# Altium footprint library 我的器件.PCBLIB: 450 footprints (part 22 of 29)
Each footprint in its own frame and in the unit in brackets; x right, y up, seen from the top. Pads: shape width x height; smd on the part's side, far side on the other; paste and mask are expansions set on the pad; w line width, h text height; cw(c..) or ccw(c..) is an arc to the next point about the centre after c.
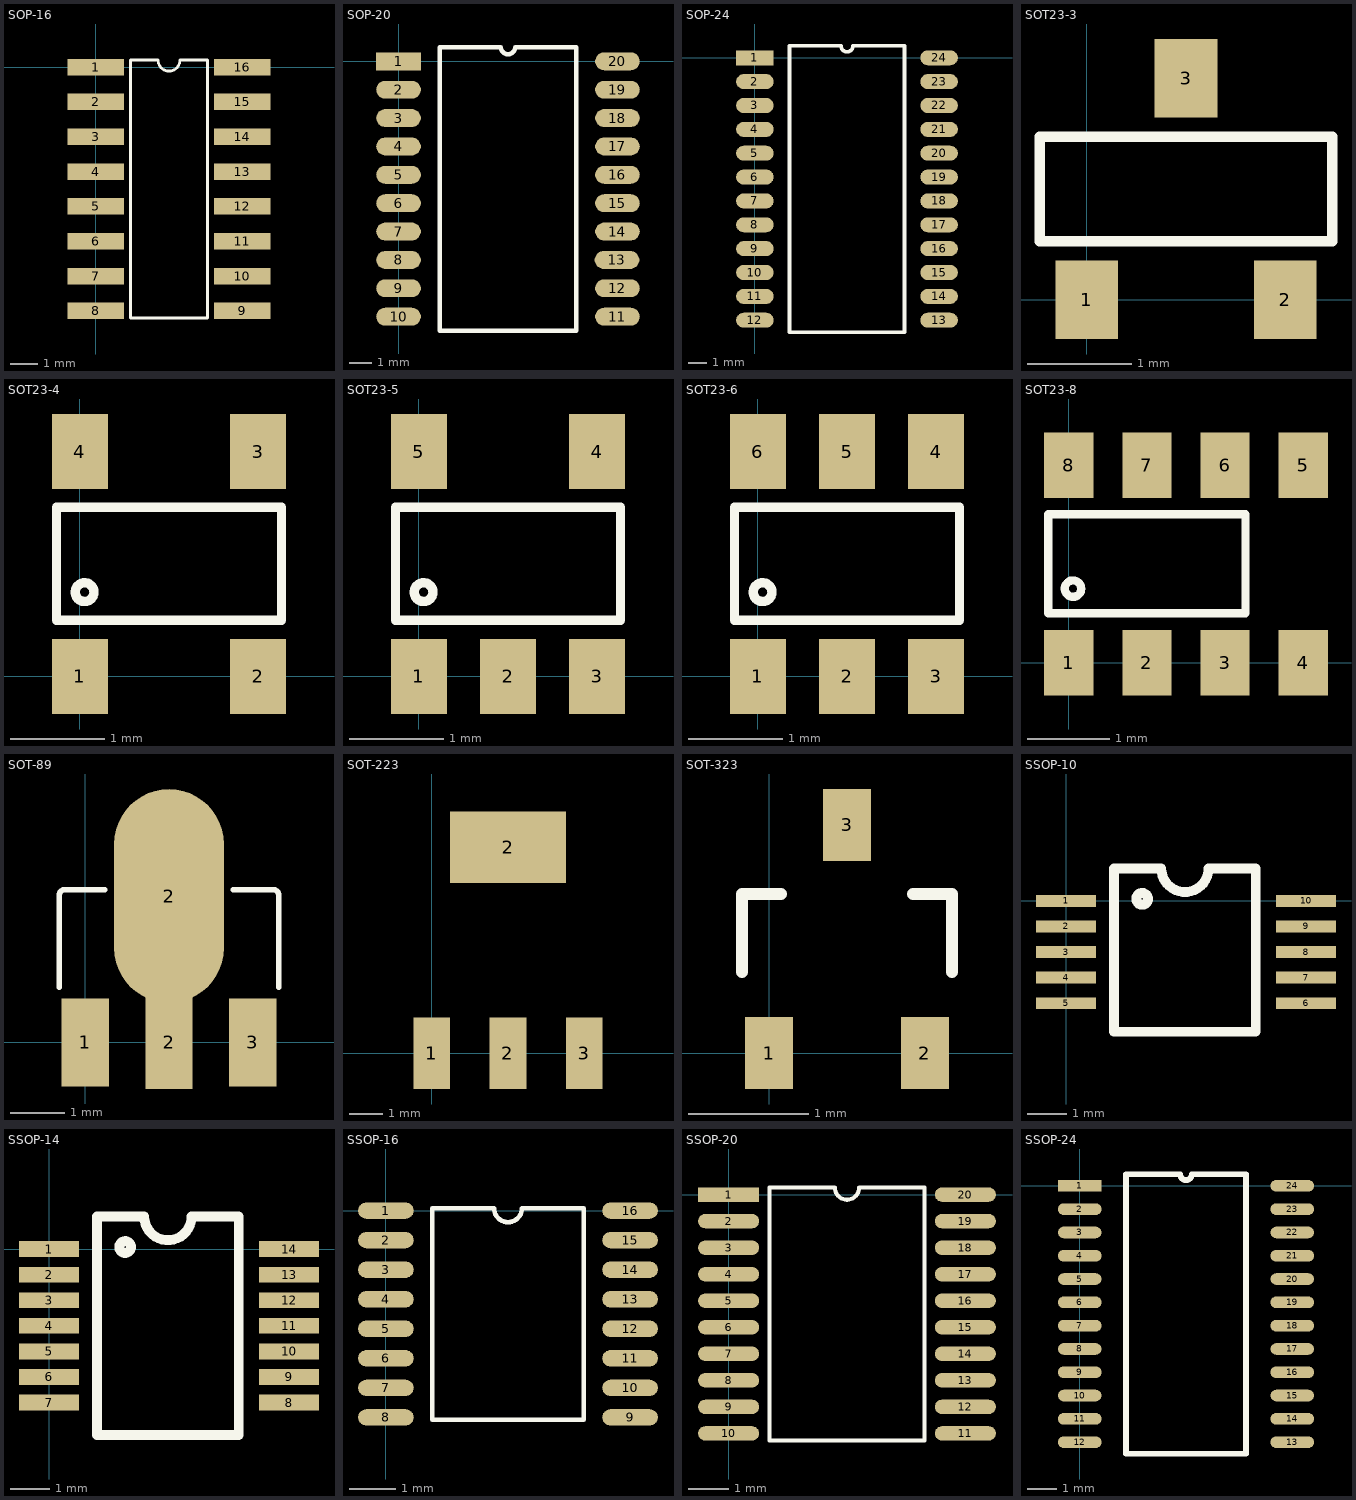
[diagram p21: the footprints below, top view; thin cyan lines are the x and y axes]

## SOP-16 [mm]
height 2
pads (16):
  rect 2.05x0.6 smd: 1(0,0) 2(0,-1.27) 3(0,-2.54) 4(0,-3.81) 5(0,-5.08) 6(0,-6.35) 7(0,-7.62) 8(0,-8.89) 9(5.35,-8.89) 10(5.35,-7.62) 11(5.35,-6.35) 12(5.35,-5.08) 13(5.35,-3.81) 14(5.35,-2.54) 15(5.35,-1.27) 16(5.35,0)
Top Overlay:
  lines w0.1: 4.075,0.255 ccw(c4.075,0.255) 4.075,0.255 ; 4.075,0.255 4.075,-9.145 1.275,-9.145 1.275,0.255 2.275,0.255 ccw(c2.675,0.255) 2.675,-0.145 ccw(c2.675,0.255) 3.075,0.255 4.075,0.255 ; 3.175,0.255 ccw(c3.175,0.255) 3.175,0.255
3D body: height 1.5, standoff 0.2, extent 0.675,-9.445 4.675,0.555
3D body: height 0.2, standoff 0, extent -0.457,-0.254 0.243,0.254
3D body: height 0.9, standoff 0, extent 0.243,-0.254 0.446,0.254
3D body: height 0.9, standoff 0.7, extent 0.446,-0.254 0.7,0.254
3D body: height 1.61, standoff 0.1, extent 1.178,-0.726 2.174,0.272
3D body: height 0.9, standoff 0.7, extent 0.446,-1.524 0.7,-1.016
3D body: height 0.9, standoff 0, extent 0.243,-1.524 0.446,-1.016
3D body: height 0.2, standoff 0, extent -0.457,-1.524 0.243,-1.016
3D body: height 0.9, standoff 0.7, extent 0.446,-2.794 0.7,-2.286
3D body: height 0.9, standoff 0, extent 0.243,-2.794 0.446,-2.286
3D body: height 0.2, standoff 0, extent -0.457,-2.794 0.243,-2.286
3D body: height 0.9, standoff 0.7, extent 0.446,-4.064 0.7,-3.556
3D body: height 0.9, standoff 0, extent 0.243,-4.064 0.446,-3.556
3D body: height 0.2, standoff 0, extent -0.457,-4.064 0.243,-3.556
3D body: height 0.9, standoff 0.7, extent 0.446,-5.334 0.7,-4.826
3D body: height 0.9, standoff 0, extent 0.243,-5.334 0.446,-4.826
3D body: height 0.2, standoff 0, extent -0.457,-5.334 0.243,-4.826
3D body: height 0.9, standoff 0.7, extent 0.446,-6.604 0.7,-6.096
3D body: height 0.9, standoff 0, extent 0.243,-6.604 0.446,-6.096
3D body: height 0.2, standoff 0, extent -0.457,-6.604 0.243,-6.096
3D body: height 0.9, standoff 0.7, extent 0.446,-7.874 0.7,-7.366
3D body: height 0.9, standoff 0, extent 0.243,-7.874 0.446,-7.366
3D body: height 0.2, standoff 0, extent -0.457,-7.874 0.243,-7.366
3D body: height 0.9, standoff 0.7, extent 0.446,-9.144 0.7,-8.636
3D body: height 0.9, standoff 0, extent 0.243,-9.144 0.446,-8.636
3D body: height 0.2, standoff 0, extent -0.457,-9.144 0.243,-8.636
3D body: height 0.9, standoff 0.7, extent 4.65,-9.144 4.904,-8.636
3D body: height 0.9, standoff 0, extent 4.904,-9.144 5.107,-8.636
3D body: height 0.2, standoff 0, extent 5.107,-9.144 5.807,-8.636
3D body: height 0.9, standoff 0.7, extent 4.65,-7.874 4.904,-7.366
3D body: height 0.9, standoff 0, extent 4.904,-7.874 5.107,-7.366
3D body: height 0.2, standoff 0, extent 5.107,-7.874 5.807,-7.366
3D body: height 0.9, standoff 0.7, extent 4.65,-6.604 4.904,-6.096
3D body: height 0.9, standoff 0, extent 4.904,-6.604 5.107,-6.096
3D body: height 0.2, standoff 0, extent 5.107,-6.604 5.807,-6.096
3D body: height 0.9, standoff 0.7, extent 4.65,-5.334 4.904,-4.826
3D body: height 0.9, standoff 0, extent 4.904,-5.334 5.107,-4.826
3D body: height 0.2, standoff 0, extent 5.107,-5.334 5.807,-4.826
3D body: height 0.9, standoff 0.7, extent 4.65,-4.064 4.904,-3.556
3D body: height 0.9, standoff 0, extent 4.904,-4.064 5.107,-3.556
3D body: height 0.2, standoff 0, extent 5.107,-4.064 5.807,-3.556
3D body: height 0.9, standoff 0.7, extent 4.65,-2.794 4.904,-2.286
3D body: height 0.9, standoff 0, extent 4.904,-2.794 5.107,-2.286
3D body: height 0.2, standoff 0, extent 5.107,-2.794 5.807,-2.286
3D body: height 0.9, standoff 0.7, extent 4.65,-1.524 4.904,-1.016
3D body: height 0.9, standoff 0, extent 4.904,-1.524 5.107,-1.016
3D body: height 0.2, standoff 0, extent 5.107,-1.524 5.807,-1.016
3D body: height 0.9, standoff 0.7, extent 4.65,-0.254 4.904,0.254
3D body: height 0.9, standoff 0, extent 4.904,-0.254 5.107,0.254
3D body: height 0.2, standoff 0, extent 5.107,-0.254 5.807,0.254

## SOP-20 [mm]
pads (20):
  rect 2x0.8 smd: 1(0,0)
  oval 2x0.8 smd: 2(0,-1.27) 3(0,-2.54) 4(0,-3.81) 5(0,-5.08) 6(0,-6.35) 7(0,-7.62) 8(0,-8.89) 9(0,-10.16) 10(0,-11.43) 11(9.8,-11.43) 12(9.8,-10.16) 13(9.779,-8.89) 14(9.8,-7.62) 15(9.8,-6.35) 16(9.8,-5.08) 17(9.8,-3.81) 18(9.8,-2.54) 19(9.8,-1.27) 20(9.8,0)
Top Overlay:
  lines w0.2: 1.835,-12.065 7.965,-12.065 7.965,0.635 5.218,0.635 cw(c4.9,0.635) 4.583,0.635 1.835,0.635 1.835,-12.065

## SOP-24 [mm]
pads (24):
  rect 2x0.8 smd: 1(0,0)
  oval 2x0.8 smd: 2(0,-1.27) 3(0,-2.54) 4(0,-3.81) 5(0,-5.08) 6(0,-6.35) 7(0,-7.62) 8(0,-8.89) 9(0,-10.16) 10(0,-11.43) 11(0,-12.7) 12(0,-13.97) 13(9.8,-13.97) 14(9.8,-12.7) 15(9.8,-11.43) 16(9.8,-10.16) 17(9.8,-8.89) 18(9.8,-7.62) 19(9.8,-6.35) 20(9.8,-5.08) 21(9.8,-3.81) 22(9.8,-2.54) 23(9.8,-1.27) 24(9.8,0)
Top Overlay:
  lines w0.2: 1.835,-14.605 1.835,0.635 4.583,0.635 ccw(c4.9,0.635) 5.218,0.635 7.965,0.635 7.965,-14.605 1.835,-14.605

## SOT23-3 [mm]
height 1
pads (3):
  rect 0.6x0.75 smd: 1(0,0) 2(1.9,0) 3(0.95,2.123)
Top Overlay:
  lines w0.1: -0.45,0.561 2.35,0.561 2.35,1.561 -0.45,1.561 -0.45,0.561
3D body: height 0.7, standoff 0.6, extent 1.7,0.261 2.1,0.411
3D body: height 0.1, standoff 0, extent 0.75,1.961 1.15,2.361
3D body: height 0.7, standoff 0, extent 0.75,1.861 1.15,1.961
3D body: height 0.7, standoff 0.6, extent 0.75,1.711 1.15,1.861
3D body: height 0.1, standoff 0, extent 1.7,-0.239 2.1,0.161
3D body: height 0.7, standoff 0, extent 1.7,0.161 2.1,0.261
3D body: height 1, standoff 0.1, extent -0.55,0.411 2.45,1.711
3D body: height 0.7, standoff 0.6, extent -0.2,0.261 0.2,0.411
3D body: height 0.7, standoff 0, extent -0.2,0.161 0.2,0.261
3D body: height 0.1, standoff 0, extent -0.2,-0.239 0.2,0.161

## SOT23-4 [mm]
pads (4):
  rect 0.6x0.8 smd: 1(0,0) 2(1.9,0) 3(1.9,2.4) 4(0,2.4)
Top Overlay:
  circle w0.1: c0.05,0.9 r0.1
  lines w0.1: -0.25,0.6 -0.25,1.806 2.15,1.806 2.15,0.6 -0.25,0.6
3D body: height 1.01, standoff 1, extent -0.25,0.6 0.15,1
3D body: height 1, standoff 0.1, extent -0.55,0.4 2.45,2
3D body: height 0.7, standoff 0.6, extent -0.25,0.2 0.25,0.4
3D body: height 0.7, standoff 0, extent -0.25,0.1 0.25,0.2
3D body: height 0.1, standoff 0, extent -0.25,-0.3 0.25,0.1
3D body: height 0.7, standoff 0.6, extent 1.65,0.2 2.15,0.4
3D body: height 0.7, standoff 0, extent 1.65,0.1 2.15,0.2
3D body: height 0.1, standoff 0, extent 1.65,-0.3 2.15,0.1
3D body: height 0.7, standoff 0.6, extent -0.25,2 0.25,2.2
3D body: height 0.7, standoff 0, extent -0.25,2.2 0.25,2.3
3D body: height 0.1, standoff 0, extent -0.25,2.3 0.25,2.7
3D body: height 0.7, standoff 0.6, extent 1.65,2 2.15,2.2
3D body: height 0.7, standoff 0, extent 1.65,2.2 2.15,2.3
3D body: height 0.1, standoff 0, extent 1.65,2.3 2.15,2.7

## SOT23-5 [mm]
height 2.54
pads (5):
  rect 0.6x0.8 smd: 1(0,0) 2(0.95,0) 3(1.9,0) 4(1.9,2.4) 5(0,2.4)
Top Overlay:
  circle w0.1: c0.05,0.9 r0.1
  lines w0.1: -0.25,0.6 2.15,0.6 2.15,1.806 -0.25,1.806 -0.25,0.6
3D body: height 0.1, standoff 0, extent 1.65,2.3 2.15,2.7
3D body: height 0.7, standoff 0, extent 1.65,2.2 2.15,2.3
3D body: height 0.7, standoff 0.6, extent 1.65,2 2.15,2.2
3D body: height 0.1, standoff 0, extent -0.25,2.3 0.25,2.7
3D body: height 0.7, standoff 0, extent -0.25,2.2 0.25,2.3
3D body: height 0.7, standoff 0.6, extent -0.25,2 0.25,2.2
3D body: height 0.1, standoff 0, extent 1.65,-0.3 2.15,0.1
3D body: height 0.7, standoff 0, extent 1.65,0.1 2.15,0.2
3D body: height 0.7, standoff 0.6, extent 1.65,0.2 2.15,0.4
3D body: height 0.1, standoff 0, extent -0.25,-0.3 0.25,0.1
3D body: height 0.7, standoff 0, extent -0.25,0.1 0.25,0.2
3D body: height 0.7, standoff 0.6, extent -0.25,0.2 0.25,0.4
3D body: height 1, standoff 0.1, extent -0.55,0.4 2.45,2
3D body: height 0.7, standoff 0.6, extent 0.7,0.2 1.2,0.4
3D body: height 0.7, standoff 0, extent 0.7,0.1 1.2,0.2
3D body: height 0.1, standoff 0, extent 0.7,-0.3 1.2,0.1
3D body: height 1.01, standoff 1, extent -0.25,0.6 0.15,1

## SOT23-6 [mm]
pads (6):
  rect 0.6x0.8 smd: 1(0,0) 2(0.95,0) 3(1.9,0) 4(1.9,2.4) 5(0.95,2.4) 6(0,2.4)
Top Overlay:
  circle w0.1: c0.05,0.9 r0.1
  lines w0.1: -0.25,0.6 -0.25,1.806 2.15,1.806 2.15,0.6 -0.25,0.6
3D body: height 1.01, standoff 1, extent -0.25,0.6 0.15,1
3D body: height 0.1, standoff 0, extent 0.7,-0.3 1.2,0.1
3D body: height 0.7, standoff 0, extent 0.7,0.1 1.2,0.2
3D body: height 0.7, standoff 0.6, extent 0.7,0.2 1.2,0.4
3D body: height 1, standoff 0.1, extent -0.55,0.4 2.45,2
3D body: height 0.7, standoff 0.6, extent -0.25,0.2 0.25,0.4
3D body: height 0.7, standoff 0, extent -0.25,0.1 0.25,0.2
3D body: height 0.1, standoff 0, extent -0.25,-0.3 0.25,0.1
3D body: height 0.7, standoff 0.6, extent 1.65,0.2 2.15,0.4
3D body: height 0.7, standoff 0, extent 1.65,0.1 2.15,0.2
3D body: height 0.1, standoff 0, extent 1.65,-0.3 2.15,0.1
3D body: height 0.7, standoff 0.6, extent -0.25,2 0.25,2.2
3D body: height 0.7, standoff 0, extent -0.25,2.2 0.25,2.3
3D body: height 0.1, standoff 0, extent -0.25,2.3 0.25,2.7
3D body: height 0.7, standoff 0.6, extent 0.7,2 1.2,2.2
3D body: height 0.7, standoff 0, extent 0.7,2.2 1.2,2.3
3D body: height 0.1, standoff 0, extent 0.7,2.3 1.2,2.7
3D body: height 0.7, standoff 0.6, extent 1.65,2 2.15,2.2
3D body: height 0.7, standoff 0, extent 1.65,2.2 2.15,2.3
3D body: height 0.1, standoff 0, extent 1.65,2.3 2.15,2.7

## SOT23-8 [mm]
pads (8):
  rect 0.6x0.8 smd: 1(0,0) 2(0.95,0) 3(1.9,0) 4(2.85,0) 5(2.85,2.4) 6(1.9,2.4) 7(0.95,2.4) 8(0,2.4)
Top Overlay:
  circle w0.1: c0.05,0.9 r0.1
  lines w0.1: -0.25,0.6 2.15,0.6 2.15,1.806 -0.25,1.806 -0.25,0.6
3D body: height 0.7, standoff 0.6, extent 2.6,0.2 3.1,0.4
3D body: height 0.7, standoff 0, extent 2.6,0.1 3.1,0.2
3D body: height 0.1, standoff 0, extent 2.6,-0.3 3.1,0.1
3D body: height 0.7, standoff 0.6, extent 2.6,2 3.1,2.2
3D body: height 0.7, standoff 0, extent 2.6,2.2 3.1,2.3
3D body: height 0.1, standoff 0, extent 2.6,2.3 3.1,2.7
3D body: height 0.1, standoff 0, extent 1.65,2.3 2.15,2.7
3D body: height 0.7, standoff 0, extent 1.65,2.2 2.15,2.3
3D body: height 0.7, standoff 0.6, extent 1.65,2 2.15,2.2
3D body: height 0.1, standoff 0, extent 0.7,2.3 1.2,2.7
3D body: height 0.7, standoff 0, extent 0.7,2.2 1.2,2.3
3D body: height 0.7, standoff 0.6, extent 0.7,2 1.2,2.2
3D body: height 0.1, standoff 0, extent -0.25,2.3 0.25,2.7
3D body: height 0.7, standoff 0, extent -0.25,2.2 0.25,2.3
3D body: height 0.7, standoff 0.6, extent -0.25,2 0.25,2.2
3D body: height 0.1, standoff 0, extent 1.65,-0.3 2.15,0.1
3D body: height 0.7, standoff 0, extent 1.65,0.1 2.15,0.2
3D body: height 0.7, standoff 0.6, extent 1.65,0.2 2.15,0.4
3D body: height 0.1, standoff 0, extent -0.25,-0.3 0.25,0.1
3D body: height 0.7, standoff 0, extent -0.25,0.1 0.25,0.2
3D body: height 0.7, standoff 0.6, extent -0.25,0.2 0.25,0.4
3D body: height 1, standoff 0.1, extent -0.55,0.4 3.402,2
3D body: height 0.7, standoff 0.6, extent 0.7,0.2 1.2,0.4
3D body: height 0.7, standoff 0, extent 0.7,0.1 1.2,0.2
3D body: height 0.1, standoff 0, extent 0.7,-0.3 1.2,0.1
3D body: height 1.01, standoff 1, extent -0.25,0.6 0.15,1

## SOT-89 [mil]
height 78.74
pads (4):
  rect 34x62.99 smd: 1(0,0) 3(120,0)
  rect 34x66.93 smd: 2(60,0)
  oval 78.74x153.54 smd: 2(60,105)
Top Overlay:
  lines w3.94: -18.74,39.7 -18.74,105.65 cw(c-14.8,105.65) -14.8,109.59 13.74,109.59 ; 106.26,109.59 134.8,109.59 cw(c134.8,105.65) 138.74,105.65 138.74,39.7
3D body: height 19.68, standoff 0, extent -12,-17.72 12,25.59
3D body: height 19.68, standoff 0, extent 25.55,115.49 94.45,151.91
3D body: height 62.99, standoff 0, extent -24.65,24.94 144.65,115.49
3D body: height 19.68, standoff 0, extent 48,-17.72 72,25.59
3D body: height 19.68, standoff 0, extent 108,-17.72 132,25.59

## SOT-223 [mm] "SOT-223/SC-73; 4 Leads; Body 6.7 x 7.3 mm, inc. leads (LxW max)"
height 1.8
pads (4):
  rect 1.1x2.15 smd: 1(0,0) 2(2.3,0) 3(4.6,0)
  rect 3.5x2.15 smd: 2(2.3,6.2)
3D body: height 0.3, standoff 0, extent 4.1,-0.55 5.1,0.675
3D body: height 0.6, standoff 0, extent 4.1,0.675 5.1,0.925
3D body: height 0.6, standoff 0.3, extent 4.1,0.925 5.1,1.5
3D body: height 0.3, standoff 0, extent 1.8,-0.575 2.8,0.65
3D body: height 0.6, standoff 0, extent 1.8,0.65 2.8,0.9
3D body: height 0.6, standoff 0.3, extent 1.8,0.9 2.8,1.475
3D body: height 0.3, standoff 0, extent -0.5,-0.575 0.5,0.65
3D body: height 0.6, standoff 0, extent -0.5,0.65 0.5,0.9
3D body: height 0.6, standoff 0.3, extent -0.5,0.9 0.5,1.475
3D body: height 0.3, standoff 0, extent 0.725,5.55 3.85,6.775
3D body: height 0.6, standoff 0, extent 0.725,5.3 3.85,5.55
3D body: height 0.6, standoff 0.3, extent 0.725,4.725 3.85,5.3
3D body: height 1.7, standoff 0, extent -1.05,1.475 5.65,4.725

## SOT-323 [mm]
height 1
pads (3):
  rect 0.4x0.6 smd: 1(0,0) 2(1.3,0) 3(0.65,1.9)
Top Overlay:
  lines w0.1: -0.225,0.675 -0.225,1.325 0.1,1.325 ; 1.2,1.325 1.525,1.325 1.525,0.675
3D body: height 1.1, standoff 0.1, extent -0.45,0.325 1.75,1.575
3D body: height 0.7, standoff 0, extent 0.45,1.725 0.85,1.825
3D body: height 0.1, standoff 0, extent 0.45,1.825 0.85,2.113
3D body: height 0.7, standoff 0.6, extent 0.45,1.575 0.85,1.725
3D body: height 0.7, standoff 0, extent -0.2,0.075 0.2,0.175
3D body: height 0.1, standoff 0, extent -0.2,-0.2 0.2,0.075
3D body: height 0.7, standoff 0.6, extent -0.2,0.175 0.2,0.325
3D body: height 0.7, standoff 0.6, extent 1.1,0.175 1.5,0.325
3D body: height 0.1, standoff 0, extent 1.1,-0.2 1.5,0.075
3D body: height 0.7, standoff 0, extent 1.1,0.075 1.5,0.175

## SSOP-10 [mm]
pads (10):
  rect 1.524x0.3 smd: 1(0,0) 2(0,-0.65) 3(0,-1.3) 4(0,-1.95) 5(0,-2.6) 6(6.096,-2.6) 7(6.096,-1.95) 8(6.096,-1.3) 9(6.096,-0.65) 10(6.096,0)
Top Overlay:
  circle w0.25: c1.933,0.051 r0.15
  lines w0.25: 1.221,-3.325 4.821,-3.325 4.821,0.825 3.621,0.825 cw(c3.021,0.825) 2.421,0.825 1.221,0.825 1.221,-3.325

## SSOP-14 [mm]
height 4.45
pads (14):
  rect 1.524x0.4 smd: 1(0,0) 2(0,-0.65) 3(0,-1.3) 4(0,-1.95) 5(0,-2.6) 6(0,-3.25) 7(0,-3.9) 8(6.096,-3.9) 9(6.096,-3.25) 10(6.096,-2.6) 11(6.096,-1.95) 12(6.096,-1.3) 13(6.096,-0.65) 14(6.096,0)
Top Overlay:
  circle w0.25: c1.933,0.051 r0.15
  lines w0.25: 1.221,-4.725 4.821,-4.725 4.821,0.825 3.621,0.825 cw(c3.021,0.825) 2.421,0.825 1.221,0.825 1.221,-4.725

## SSOP-16 [mm] "0.635mm"
pads (16):
  oval 1.2x0.35 smd: 1(0,0) 2(0,-0.635) 3(0,-1.27) 4(0,-1.905) 5(0,-2.54) 6(0,-3.175) 7(0,-3.81) 8(0,-4.445) 9(5.25,-4.445) 10(5.25,-3.81) 11(5.25,-3.175) 12(5.25,-2.54) 13(5.25,-1.905) 14(5.25,-1.27) 15(5.25,-0.635) 16(5.25,0)
Top Overlay:
  lines w0.1: 4.25,-4.497 1,-4.497 1,0.052 2.325,0.052 ccw(c2.625,0.052) 2.625,-0.248 ccw(c2.625,0.052) 2.925,0.052 4.25,0.052 4.25,-4.498 ; 4.25,-4.498 4.25,-4.498
3D body: height 1.75, standoff 0.35, extent 0.625,-4.722 4.625,0.278
3D body: height 1.76, standoff 1.75, extent 0.878,-0.622 1.475,-0.023
3D body: height 1, standoff 0.9, extent 0.225,-0.15 0.625,0.15
3D body: height 1, standoff 0, extent 0.125,-0.15 0.225,0.15
3D body: height 0.1, standoff 0, extent -0.425,-0.15 0.125,0.15
3D body: height 0.1, standoff 0, extent -0.425,-0.785 0.125,-0.485
3D body: height 1, standoff 0, extent 0.125,-0.785 0.225,-0.485
3D body: height 1, standoff 0.9, extent 0.225,-0.785 0.625,-0.485
3D body: height 0.1, standoff 0, extent -0.425,-1.42 0.125,-1.12
3D body: height 1, standoff 0, extent 0.125,-1.42 0.225,-1.12
3D body: height 1, standoff 0.9, extent 0.225,-1.42 0.625,-1.12
3D body: height 0.1, standoff 0, extent -0.425,-2.055 0.125,-1.755
3D body: height 1, standoff 0, extent 0.125,-2.055 0.225,-1.755
3D body: height 1, standoff 0.9, extent 0.225,-2.055 0.625,-1.755
3D body: height 0.1, standoff 0, extent -0.425,-2.69 0.125,-2.39
3D body: height 1, standoff 0, extent 0.125,-2.69 0.225,-2.39
3D body: height 1, standoff 0.9, extent 0.225,-2.69 0.625,-2.39
3D body: height 0.1, standoff 0, extent -0.425,-3.325 0.125,-3.025
3D body: height 1, standoff 0, extent 0.125,-3.325 0.225,-3.025
3D body: height 1, standoff 0.9, extent 0.225,-3.325 0.625,-3.025
3D body: height 0.1, standoff 0, extent -0.425,-3.96 0.125,-3.66
3D body: height 1, standoff 0, extent 0.125,-3.96 0.225,-3.66
3D body: height 1, standoff 0.9, extent 0.225,-3.96 0.625,-3.66
3D body: height 0.1, standoff 0, extent -0.425,-4.595 0.125,-4.295
3D body: height 1, standoff 0, extent 0.125,-4.595 0.225,-4.295
3D body: height 1, standoff 0.9, extent 0.225,-4.595 0.625,-4.295
3D body: height 0.1, standoff 0, extent 5.125,-4.595 5.675,-4.295
3D body: height 1, standoff 0, extent 5.025,-4.595 5.125,-4.295
3D body: height 1, standoff 0.9, extent 4.625,-4.595 5.025,-4.295
3D body: height 0.1, standoff 0, extent 5.125,-3.96 5.675,-3.66
3D body: height 1, standoff 0, extent 5.025,-3.96 5.125,-3.66
3D body: height 1, standoff 0.9, extent 4.625,-3.96 5.025,-3.66
3D body: height 0.1, standoff 0, extent 5.125,-3.325 5.675,-3.025
3D body: height 1, standoff 0, extent 5.025,-3.325 5.125,-3.025
3D body: height 1, standoff 0.9, extent 4.625,-3.325 5.025,-3.025
3D body: height 0.1, standoff 0, extent 5.125,-2.69 5.675,-2.39
3D body: height 1, standoff 0, extent 5.025,-2.69 5.125,-2.39
3D body: height 1, standoff 0.9, extent 4.625,-2.69 5.025,-2.39
3D body: height 0.1, standoff 0, extent 5.125,-2.055 5.675,-1.755
3D body: height 1, standoff 0, extent 5.025,-2.055 5.125,-1.755
3D body: height 1, standoff 0.9, extent 4.625,-2.055 5.025,-1.755
3D body: height 0.1, standoff 0, extent 5.125,-1.42 5.675,-1.12
3D body: height 1, standoff 0, extent 5.025,-1.42 5.125,-1.12
3D body: height 1, standoff 0.9, extent 4.625,-1.42 5.025,-1.12
3D body: height 0.1, standoff 0, extent 5.125,-0.785 5.675,-0.485
3D body: height 1, standoff 0, extent 5.025,-0.785 5.125,-0.485
3D body: height 1, standoff 0.9, extent 4.625,-0.785 5.025,-0.485
3D body: height 0.1, standoff 0, extent 5.125,-0.15 5.675,0.15
3D body: height 1, standoff 0, extent 5.025,-0.15 5.125,0.15
3D body: height 1, standoff 0.9, extent 4.625,-0.15 5.025,0.15

## SSOP-20 [mm]
pads (20):
  rect 1.5x0.35 smd: 1(0,0)
  oval 1.5x0.35 smd: 2(0,-0.65) 3(0,-1.3) 4(0,-1.95) 5(0,-2.6) 6(0,-3.25) 7(0,-3.9) 8(0,-4.55) 9(0,-5.2) 10(0,-5.85) 11(5.8,-5.85) 12(5.8,-5.2) 13(5.8,-4.55) 14(5.8,-3.9) 15(5.8,-3.25) 16(5.8,-2.6) 17(5.8,-1.95) 18(5.8,-1.3) 19(5.8,-0.65) 20(5.8,0)
Top Overlay:
  lines w0.1: 1,-6.025 4.8,-6.025 4.8,0.175 3.2,0.175 cw(c2.9,0.175) 2.9,-0.125 cw(c2.9,0.175) 2.6,0.175 1,0.175 1,-6.025
3D body: height 0.4, standoff 0.3, extent 4.9,-0.151 5.3,0.151
3D body: height 0.4, standoff 0, extent 5.3,-0.15 5.4,0.152
3D body: height 0.1, standoff 0, extent 5.4,-0.15 6.2,0.152
3D body: height 0.4, standoff 0.3, extent 4.9,-0.801 5.3,-0.499
3D body: height 0.4, standoff 0, extent 5.3,-0.8 5.4,-0.498
3D body: height 0.1, standoff 0, extent 5.4,-0.8 6.2,-0.498
3D body: height 0.4, standoff 0.3, extent 4.9,-1.451 5.3,-1.149
3D body: height 0.4, standoff 0, extent 5.3,-1.45 5.4,-1.148
3D body: height 0.1, standoff 0, extent 5.4,-1.45 6.2,-1.148
3D body: height 0.4, standoff 0.3, extent 4.9,-2.101 5.3,-1.799
3D body: height 0.4, standoff 0, extent 5.3,-2.1 5.4,-1.798
3D body: height 0.1, standoff 0, extent 5.4,-2.1 6.2,-1.798
3D body: height 0.4, standoff 0.3, extent 4.9,-2.751 5.3,-2.449
3D body: height 0.4, standoff 0, extent 5.3,-2.75 5.4,-2.448
3D body: height 0.1, standoff 0, extent 5.4,-2.75 6.2,-2.448
3D body: height 0.4, standoff 0.3, extent 4.9,-3.401 5.3,-3.099
3D body: height 0.4, standoff 0, extent 5.3,-3.4 5.4,-3.098
3D body: height 0.1, standoff 0, extent 5.4,-3.4 6.2,-3.098
3D body: height 0.4, standoff 0.3, extent 4.9,-4.051 5.3,-3.749
3D body: height 0.4, standoff 0, extent 5.3,-4.05 5.4,-3.748
3D body: height 0.1, standoff 0, extent 5.4,-4.05 6.2,-3.748
3D body: height 0.4, standoff 0.3, extent 4.9,-4.701 5.3,-4.399
3D body: height 0.4, standoff 0, extent 5.3,-4.7 5.4,-4.398
3D body: height 0.1, standoff 0, extent 5.4,-4.7 6.2,-4.398
3D body: height 0.4, standoff 0.3, extent 4.9,-5.351 5.3,-5.049
3D body: height 0.4, standoff 0, extent 5.3,-5.35 5.4,-5.048
3D body: height 0.1, standoff 0, extent 5.4,-5.35 6.2,-5.048
3D body: height 0.4, standoff 0.3, extent 4.9,-6.001 5.3,-5.699
3D body: height 0.4, standoff 0, extent 5.3,-6 5.4,-5.698
3D body: height 0.1, standoff 0, extent 5.4,-6 6.2,-5.698
3D body: height 0.4, standoff 0.3, extent 0.5,-6.001 0.9,-5.699
3D body: height 0.4, standoff 0, extent 0.4,-6.002 0.5,-5.7
3D body: height 0.1, standoff 0, extent -0.4,-6.002 0.4,-5.7
3D body: height 0.4, standoff 0.3, extent 0.5,-5.351 0.9,-5.049
3D body: height 0.4, standoff 0, extent 0.4,-5.352 0.5,-5.05
3D body: height 0.1, standoff 0, extent -0.4,-5.352 0.4,-5.05
3D body: height 0.4, standoff 0.3, extent 0.5,-4.701 0.9,-4.399
3D body: height 0.4, standoff 0, extent 0.4,-4.702 0.5,-4.4
3D body: height 0.1, standoff 0, extent -0.4,-4.702 0.4,-4.4
3D body: height 0.4, standoff 0.3, extent 0.5,-4.051 0.9,-3.749
3D body: height 0.4, standoff 0, extent 0.4,-4.052 0.5,-3.75
3D body: height 0.1, standoff 0, extent -0.4,-4.052 0.4,-3.75
3D body: height 0.4, standoff 0.3, extent 0.5,-3.401 0.9,-3.099
3D body: height 0.4, standoff 0, extent 0.4,-3.402 0.5,-3.1
3D body: height 0.1, standoff 0, extent -0.4,-3.402 0.4,-3.1
3D body: height 0.4, standoff 0.3, extent 0.5,-3.401 0.9,-3.099
3D body: height 0.4, standoff 0, extent 0.4,-3.402 0.5,-3.1
3D body: height 0.1, standoff 0, extent -0.4,-3.402 0.4,-3.1
3D body: height 0.4, standoff 0.3, extent 0.5,-2.751 0.9,-2.449
3D body: height 0.4, standoff 0, extent 0.4,-2.752 0.5,-2.45
3D body: height 0.1, standoff 0, extent -0.4,-2.752 0.4,-2.45
3D body: height 0.4, standoff 0.3, extent 0.5,-2.101 0.9,-1.799
3D body: height 0.4, standoff 0, extent 0.4,-2.102 0.5,-1.8
3D body: height 0.1, standoff 0, extent -0.4,-2.102 0.4,-1.8
3D body: height 0.4, standoff 0.3, extent 0.5,-1.451 0.9,-1.149
3D body: height 0.4, standoff 0, extent 0.4,-1.452 0.5,-1.15
3D body: height 0.1, standoff 0, extent -0.4,-1.452 0.4,-1.15
3D body: height 0.4, standoff 0.3, extent 0.5,-2.101 0.9,-1.799
3D body: height 0.4, standoff 0, extent 0.4,-2.102 0.5,-1.8
3D body: height 0.1, standoff 0, extent -0.4,-2.102 0.4,-1.8
3D body: height 0.4, standoff 0.3, extent 0.5,-1.451 0.9,-1.149
3D body: height 0.4, standoff 0, extent 0.4,-1.452 0.5,-1.15
3D body: height 0.1, standoff 0, extent -0.4,-1.452 0.4,-1.15
3D body: height 0.4, standoff 0.3, extent 0.5,-0.801 0.9,-0.499
3D body: height 0.4, standoff 0, extent 0.4,-0.802 0.5,-0.5
3D body: height 0.1, standoff 0, extent -0.4,-0.802 0.4,-0.5
3D body: height 0.1, standoff 0, extent -0.4,-0.152 0.4,0.15
3D body: height 0.4, standoff 0, extent 0.4,-0.152 0.5,0.15
3D body: height 0.4, standoff 0.3, extent 0.5,-0.151 0.9,0.151
3D body: height 0.81, standoff 0.1, extent 1.202,-0.599 1.8,-0.001
3D body: height 0.7, standoff 0.1, extent 0.9,-6.175 4.9,0.325

## SSOP-24 [mm]
pads (24):
  rect 1.5x0.4 smd: 1(0,0)
  oval 1.5x0.4 smd: 2(0,-0.8) 3(0,-1.6) 4(0,-2.4) 5(0,-3.2) 6(0,-4) 7(0,-4.8) 8(0,-5.6) 9(0,-6.4) 10(0,-7.2) 11(0,-8) 12(0,-8.8) 13(7.3,-8.8) 14(7.3,-8) 15(7.3,-7.2) 16(7.3,-6.4) 17(7.3,-5.6) 18(7.3,-4.8) 19(7.3,-4) 20(7.3,-3.2) 21(7.3,-2.4) 22(7.3,-1.6) 23(7.3,-0.8) 24(7.3,0)
Top Overlay:
  lines w0.2: 1.585,-9.2 5.715,-9.2 5.715,0.4 3.85,0.4 cw(c3.65,0.4) 3.45,0.4 1.585,0.4 1.585,-9.2